# Altium footprint library microbuilder.PCBLIB: 422 footprints (part 10 of 27)
Each footprint in its own frame and in the unit in brackets; x right, y up, seen from the top. Pads: shape width x height; smd on the part's side, far side on the other; paste and mask are expansions set on the pad; w line width, h text height; cw(c..) or ccw(c..) is an arc to the next point about the centre after c.
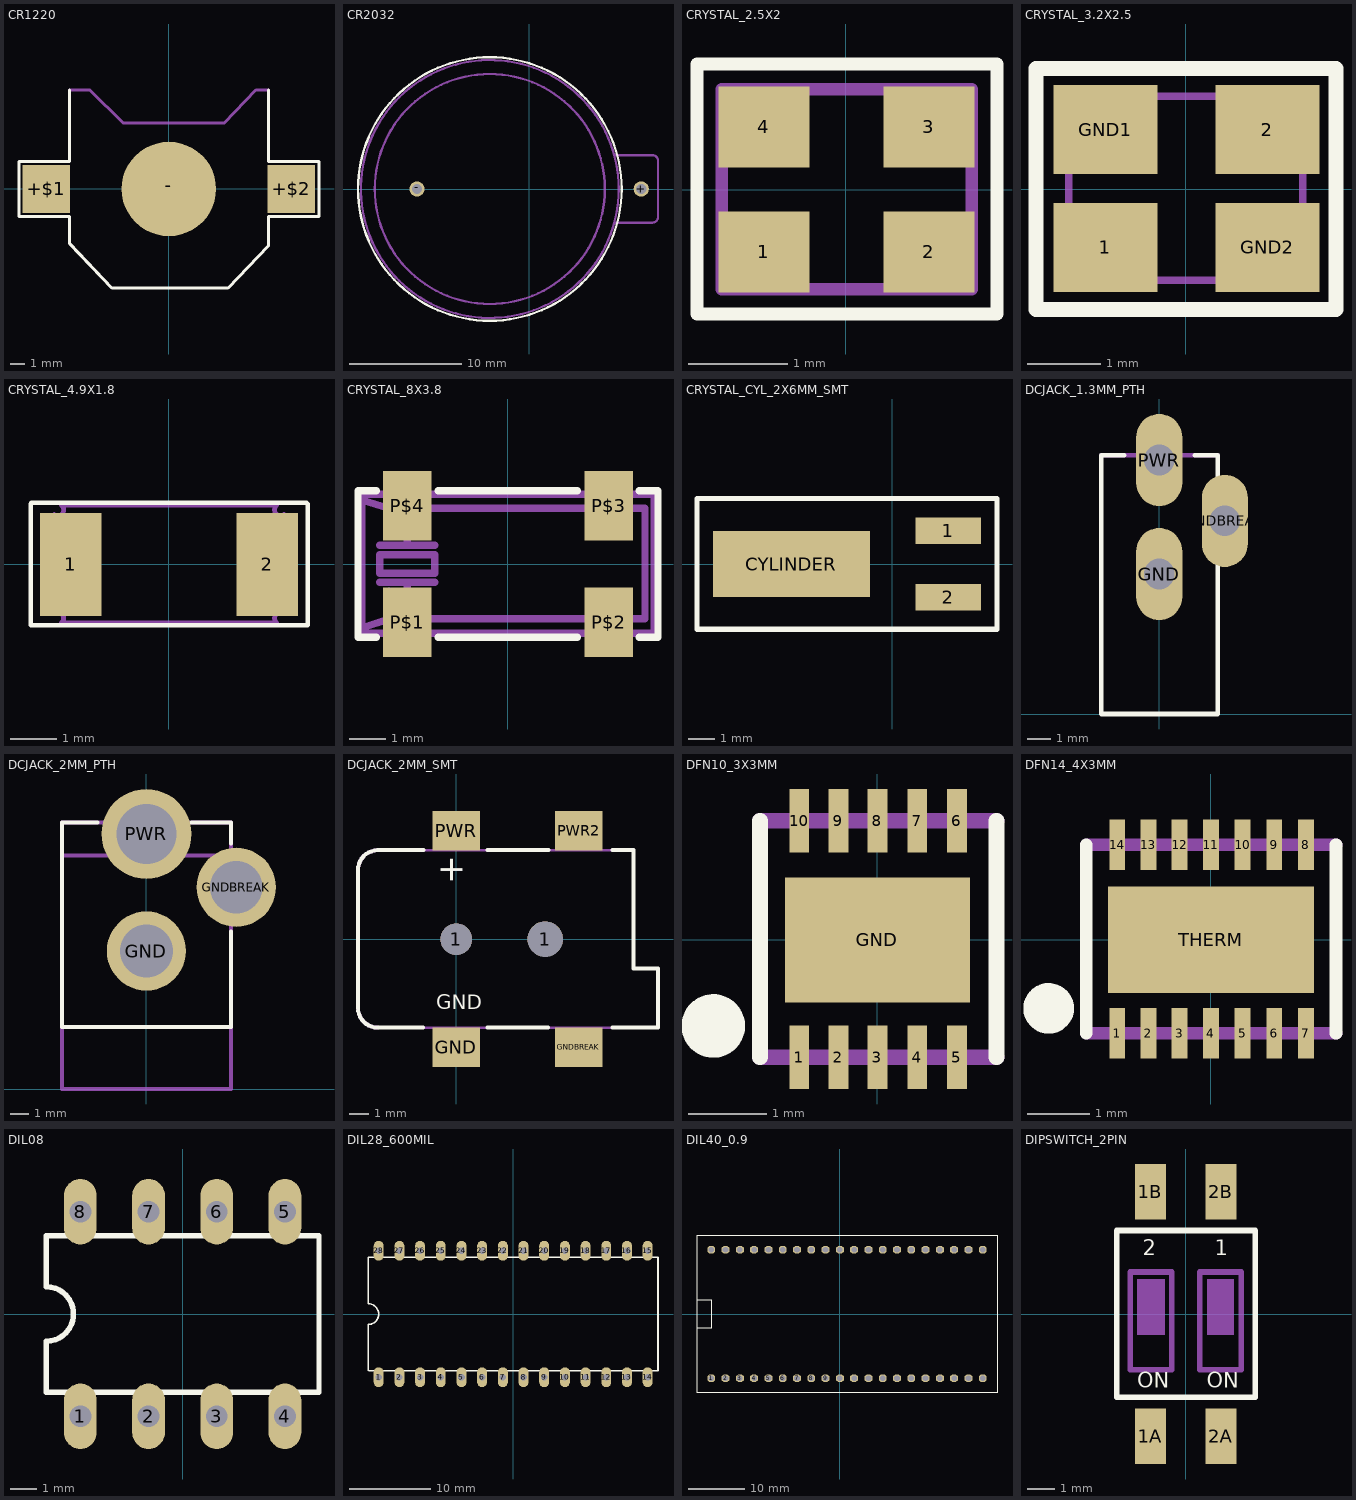
[diagram p9: the footprints below, top view; thin cyan lines are the x and y axes]

## CR1220 [mil]
pads (3):
  rect 126x126 smd: +$1(-323.83,0) +$2(324,0)
  rrect100% 250x250 smd: -(0,0)
Top Overlay:
  lines w8: -262.2,262 -262.2,73 -396.28,73 -396.28,-72.44 -262.2,-72.44 -262.2,-144.57 -150.63,-262.2 157,-262.2 263,-150.63 263,-72.44 397,-72.44 397,73 263,73 263,262
Top Solder:
  circle w0: c0,0 r248
Mechanical 16:
  circle w8: c-325.96,0 r37
  circle w8: c332,7 r37
  lines w8: -262.2,262 -210,262 -120,174 146,174 230,262 263,262

## CR2032 [mil]
pads (2):
  round 54 hole 36: +(394,0) -(-393.7,0)
Top Overlay:
  circle w8: c-137.8,0 r463
Mechanical 16:
  circle w8: c-137.8,0 r453
  circle w8: c-137.8,0 r404
  lines w8: 300,-118.11 434,-118.11 ccw(c433.66,-98.77) 453,-98.43 453,99 ccw(c433.5,99.5) 434,119 300,119

## CRYSTAL_2.5X2 [mil]
pads (4):
  rect 36x32 smd: 1(-32.48,-24.61) 2(33,-24.61) 3(33,25) 4(-32.48,25)
Top Overlay:
  lines w5: -59.06,-49.21 60,-49.21 60,50 -59.06,50 -59.06,-49.21
Mechanical 16:
  lines w5: -49.21,-39.37 50,-39.37 50,40 -49.21,40 -49.21,-39.37

## CRYSTAL_3.2X2.5 [mil]
pads (4):
  rect 56x48 smd: 1(-43.31,-31.5) 2(44,32) GND1(-43.31,32) GND2(44,-31.5)
Top Overlay:
  lines w8: -80.71,-64.96 81,-64.96 81,65 -80.71,65 -80.71,-64.96
Mechanical 16:
  lines w4: -62.99,-41.34 -62.99,42 ccw(c-59.06,46) -55.12,50 56,50 ccw(c59.5,46) 63,42 63,-41.34 ccw(c59.5,-45.28) 56,-49.21 -55.12,-49.21 ccw(c-59.06,-45.28) -62.99,-41.34

## CRYSTAL_4.9X1.8 [mil]
pads (2):
  rect 52x87 smd: 1(-82.68,0) 2(83,0)
Top Overlay:
  lines w4: -116.32,-50.93 -116.32,51 ; -115.93,-51.18 116,-51.18 ; -115.93,52 116,52 ; 117,-50.93 117,51
Mechanical 16:
  lines w4: -96.46,-41.34 -96.46,42 ccw(c-93.5,46) -90.55,50 91,50 ccw(c94,46) 97,42 97,-41.34 ccw(c94,-45.28) 91,-49.21 -90.55,-49.21 ccw(c-93.5,-45.28) -96.46,-41.34

## CRYSTAL_8X3.8 [mil]
pads (4):
  rect 52x75 smd: P$1(-108.27,-62.99) P$2(109,-62.99) P$3(109,63) P$4(-108.27,63)
Top Overlay:
  lines w8: -141.73,-78.74 -161.42,-78.74 -161.42,79 -141.73,79 ; -74.8,-78.74 75,-78.74 ; -74.8,79 75,79 ; 142,-78.74 162,-78.74 162,79 142,79
Mechanical 16:
  circle w8: c-108.27,50 r10
  circle w8: c-108.27,-49.21 r10
  lines w8: -137.8,-19.68 -108.27,-19.68 ; -137.8,20 -108.27,20 ; -127.95,-29.53 -127.95,-59.06 ; -127.95,30 -127.95,60 ; -108.27,-49.21 -108.27,-19.68 ; -108.27,50 -108.27,20 ; -78.74,-19.68 -108.27,-19.68 ; -78.74,20 -108.27,20 ; -157.48,-68.9 -157.48,-74.8 158,-74.8 158,75 -157.48,75 -157.48,69 ; -157.48,-68.9 -157.48,69 ; -157.48,-68.9 -127.95,-59.06 ; -157.48,69 -127.95,60 ; -127.95,-59.06 148,-59.06 148,60 -127.95,60 ; -137.8,-9.84 -78.74,-9.84 -78.74,10 -137.8,10 -137.8,-9.84

## CRYSTAL_CYL_2X6MM_SMT [mil]
pads (3):
  rect 99x40 smd: 1(84,50) 2(84,-50)
  rect 237x99 smd: CYLINDER(-152.56,0)
Top Overlay:
  lines w8: -295.28,-98.43 158,-98.43 158,99 -295.28,99 -295.28,-98.43

## DCJACK_1.3MM_PTH [mil]
pads (3):
  oval 78x156 hole 52: GND(0,237) GNDBREAK(111,327) PWR(0,430)
Top Overlay:
  lines w8: -59.06,438 -98.43,438 -98.43,0 99,0 99,438 60,438
Mechanical 16:
  lines w5: -98.43,438 -98.43,0 99,0 99,438
  lines w8: -98.43,438 99,438
  text "DC 1.3" at -78.82,19 h49.6

## DCJACK_2MM_PTH [mil]
pads (3):
  round 166.5 hole 111: GND(0,290) GNDBREAK(189,424)
  round 189 hole 126: PWR(0,536)
Top Overlay:
  lines w8: -102.36,560 -177.17,560 -177.17,130 178,130 178,331 ; 95,560 178,560 178,516
Mechanical 16:
  lines w8: 174,491 -177.17,491 ; -177.17,130 -177.17,0 178,0 178,130 ; -177.17,130 178,130 ; -177.17,130 -177.17,491 ; -177.17,491 -177.17,560 95,560 105,560 178,560 178,331 178,329 178,130
  text "DC 2.0/2.1" at -130,50 h49.6

## DCJACK_2MM_SMT [mil]
pads (6):
  round 63 hole 63: 1(0,0)
  round 71 hole 71: 1(178,0)
  rect 95x79 smd: GND(0,-216.54) GNDBREAK(245,-216.54) PWR(0,217) PWR2(245,217)
Top Overlay:
  lines w8: -66.3,-177.17 -157.48,-177.17 cw(c-157.48,-137.8) -196.85,-137.8 -196.85,138 cw(c-157.17,138.31) -157.48,178 -65.67,178 ; 63,-177.17 184,-177.17 ; 63,178 185,178 ; 313,-177.17 404,-177.17 404,-58.74 355,-58.74 355,178 313,178
  text "+" at 30,110 h86.8
  text "GND" at -40,-150 h49.6
Mechanical 16:
  lines w5: -196.85,-137.8 -196.85,138 ; -157.48,-177.17 404,-177.17 404,-58.74 355,-58.74 355,178 -157.48,178
  lines w8: -196.85,-137.8 ccw(c-157.48,-137.8) -157.48,-177.17 ; -196.85,138 cw(c-157.17,138.31) -157.48,178

## DFN10_3X3MM [mil]
pads (11):
  rect 10x32 smd: 1(-39.37,-59.06) 2(-19.68,-59.06) 3(0,-59.06) 4(20,-59.06) 5(40,-59.06) 6(40,60) 7(20,60) 8(0,60) 9(-19.68,60) 10(-39.37,60)
  rect 93x63 smd: GND(0,0)
Top Overlay:
  circle w16: c-82.68,-43.31 r8
  lines w8: -59.06,-59.06 -59.06,60 ; 60,-59.06 60,60
Top Paste:
  rectangle: -39.37,4 -19.68,24
  rectangle: -39.37,-23.62 -19.68,-3.94
  rectangle: 20,4 40,24
  rectangle: 20,-23.62 40,-3.94
  rectangle: -11.81,-23.62 12,24
Mechanical 16:
  lines w5: -59.06,-59.06 -59.06,60 ; 60,-59.06 60,60
  lines w8: -59.06,-59.06 60,-59.06 ; -59.06,60 60,60

## DFN14_4X3MM [mil]
pads (15):
  rect 10x32 smd: 1(-59.06,-59.06) 2(-39.37,-59.06) 3(-19.68,-59.06) 4(0,-59.06) 5(20,-59.06) 6(40,-59.06) 7(60,-59.06) 8(60,60) 9(40,60) 10(20,60) 11(0,60) 12(-19.68,60) 13(-39.37,60) 14(-59.06,60)
  rect 130x67 smd: THERM(0,0)
Top Overlay:
  circle w16: c-102.36,-43.31 r8
  lines w8: -78.74,-59.06 -78.74,60 ; 79,-59.06 79,60
Top Paste:
  rectangle: -31.5,-23.62 -7.87,24
  rectangle: 8,-23.62 32,24
  rectangle: -61.02,-23.62 -37.4,24
  rectangle: 38,-23.62 62,24
Mechanical 16:
  lines w5: -78.74,-59.06 -78.74,60 ; 79,-59.06 79,60
  lines w8: -78.74,-59.06 79,-59.06 ; -78.74,60 79,60

## DIL08 [mil]
pads (8):
  oval 48x96 hole 32: 1(-150,-150) 2(-50,-150) 3(50,-150) 4(150,-150) 5(150,150) 6(50,150) 7(-50,150) 8(-150,150)
Top Overlay:
  lines w8: -200,-115 200,-115 200,115 -200,115 -200,40 cw(c-200,0) -200,-40 -200,-115

## DIL28_600MIL [mil]
pads (28):
  oval 48x96 hole 32: 1(-650,-305.12) 2(-550,-305.12) 3(-450,-305.12) 4(-350,-305.12) 5(-250,-305.12) 6(-150,-305.12) 7(-50,-305.12) 8(50,-305.12) 9(150,-305.12) 10(250,-305.12) 11(350,-305.12) 12(450,-305.12) 13(550,-305.12) 14(650,-305.12) 15(650,306) 16(550,306) 17(450,306) 18(350,306) 19(250,306) 20(150,306) 21(50,306) 22(-50,306) 23(-150,306) 24(-250,306) 25(-350,306) 26(-450,306) 27(-550,306) 28(-650,306)
Top Overlay:
  lines w8: -700,-273.62 -700,-50 ccw(c-700,0) -700,50 -700,274 700,274 700,-273.62 -695,-273.62

## DIL40_0.9 [mil]
pads (40):
  oct 55x55 hole 40: 1(-900,-450) 2(-800,-450) 3(-700,-450) 4(-600,-450) 5(-500,-450) 6(-400,-450) 7(-300,-450) 8(-200,-450) 9(-100,-450) 10(0,-450) 11(100,-450) 12(200,-450) 13(300,-450) 14(400,-450) 15(500,-450) 16(600,-450) 17(700,-450) 18(800,-450) 19(900,-450) 20(1000,-450) 21(1000,450) 22(900,450) 23(800,450) 24(700,450) 25(600,450) 26(500,450) 27(400,450) 28(300,450) 29(200,450) 30(100,450) 31(0,450) 32(-100,450) 33(-200,450) 34(-300,450) 35(-400,450) 36(-500,450) 37(-600,450) 38(-700,450) 39(-800,450) 40(-900,450)
Top Overlay:
  lines w8: -1000,-100 -1000,-550 1100,-550 1100,550 -1000,550 -1000,100 ; -1000,-100 -1000,100 ; -1000,-100 -900,-100 -900,100 -1000,100

## DIPSWITCH_2PIN [mil]
pads (4):
  rect 44x79 smd: 1A(-50,-173.23) 1B(-50,174) 2A(50,-173.23) 2B(50,174)
Top Overlay:
  lines w8: -98.03,-118.11 -98.03,119 99,119 99,-118.11 -98.03,-118.11
  text "ON" at -68.9,-111.26 h37.2
  text "ON" at 30,-111.26 h37.2
  text "1" at 41,77 h37.2
  text "2" at -60.63,77 h37.2
Mechanical 16:
  rectangle: -68.9,-29.53 -29.53,50
  rectangle: 30,-29.53 69,50
  lines w5: -98.03,-118.11 99,-118.11 99,119 -98.03,119 -98.03,-118.11
  lines w8: -78.74,-78.74 -19.68,-78.74 -19.68,60 -78.74,60 -78.74,-78.74 ; 20,-78.74 79,-78.74 79,60 20,60 20,-78.74
  text "1" at 41,77 h37.2
  text "2" at -60.63,77 h37.2
  text "ON" at -68.9,-111.26 h37.2
  text "ON" at 30,-111.26 h37.2